# Altium footprint library common.PcbLib: 552 footprints (part 13 of 35)
Each footprint in its own frame and in the unit in brackets; x right, y up, seen from the top. Pads: shape width x height; smd on the part's side, far side on the other; paste and mask are expansions set on the pad; w line width, h text height; cw(c..) or ccw(c..) is an arc to the next point about the centre after c.
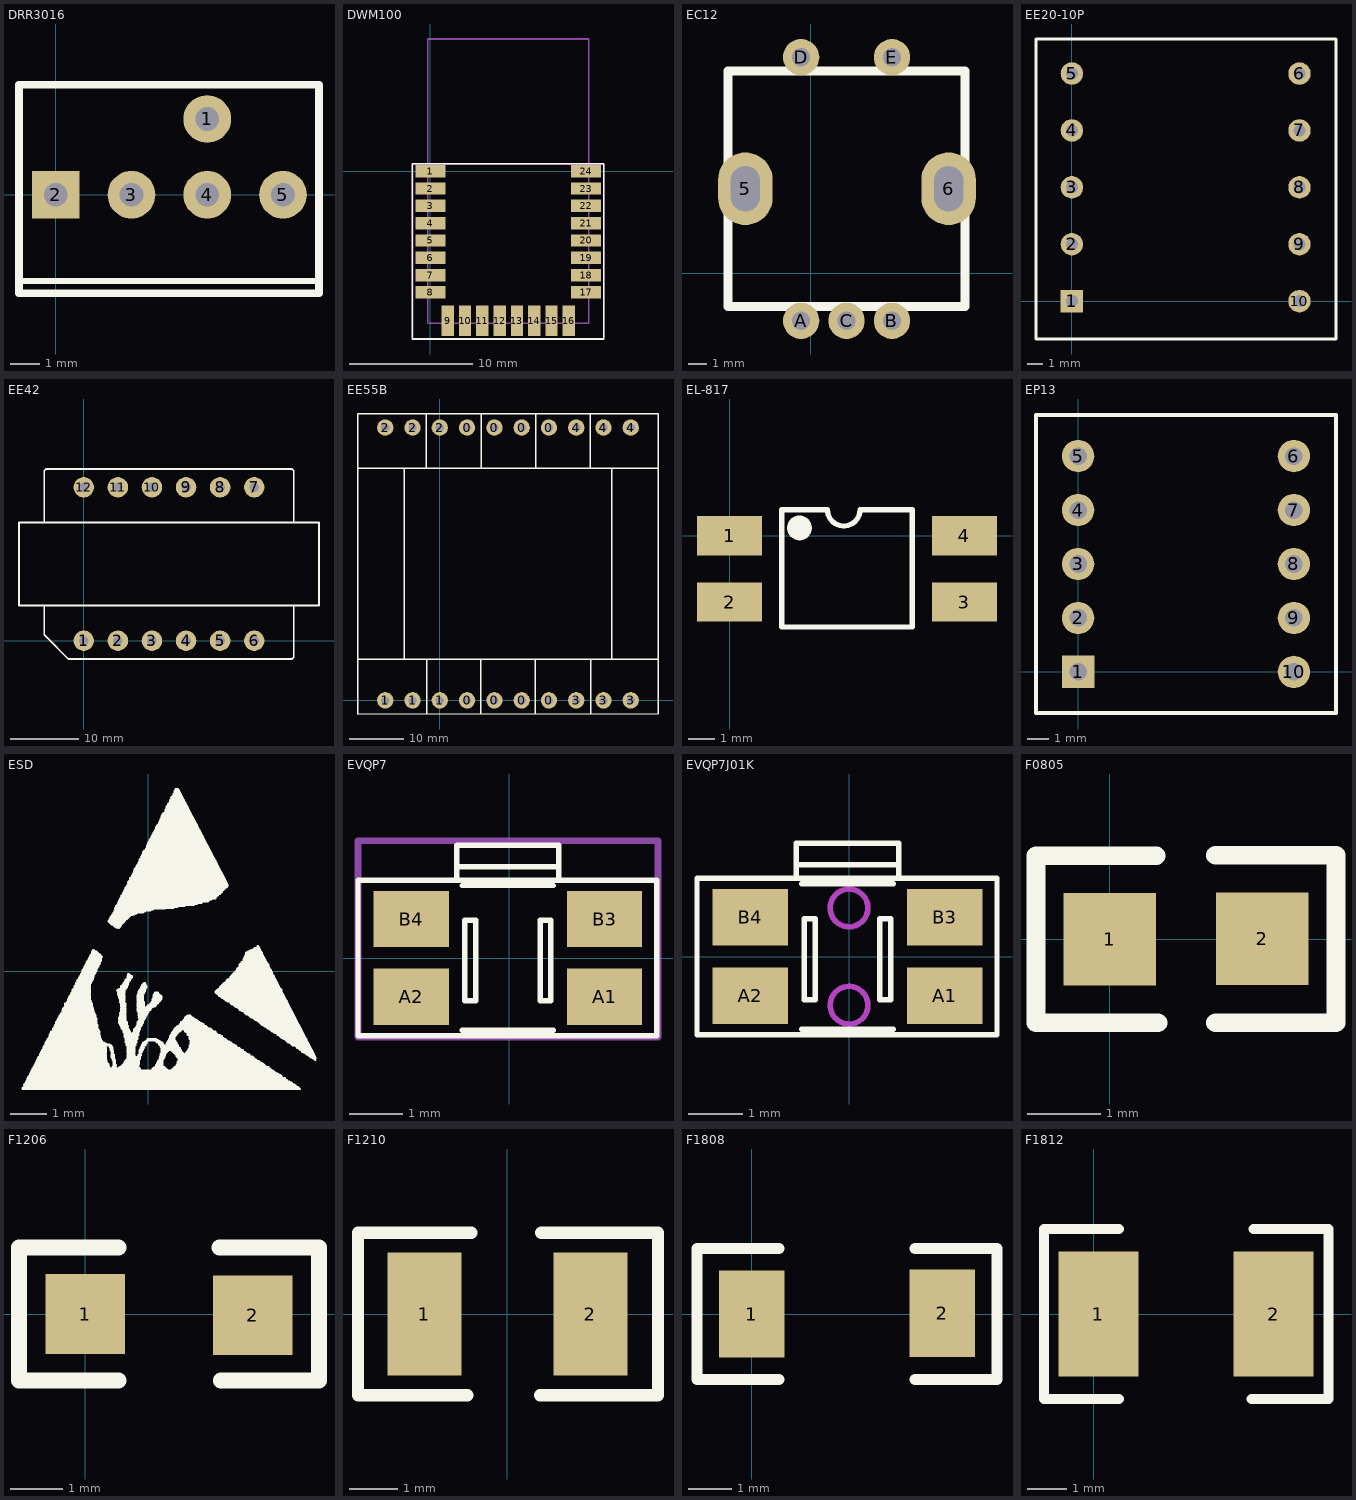
[diagram p12: the footprints below, top view; thin cyan lines are the x and y axes]

## DRR3016 [mm]
height 2.38
pads (5):
  round 1.6 hole 0.8: 1(5.08,2.54) 3(2.54,0) 4(5.08,0) 5(7.62,0)
  rect 1.6x1.6 hole 0.8: 2(0,0)
Top Overlay:
  lines w0.2: -1.23,-2.896 8.738,-2.896
  lines w0.254: -1.23,-3.3 -1.23,3.685 8.828,3.685 8.828,-3.3 -1.23,-3.3
3D body: height 11, standoff -2.9, extent -1.19,-3.306 8.81,3.694

## DWM100 [mm]
pads (24):
  rect 2.45x1 smd: 1(0,0) 2(0,-1.4) 3(0,-2.8) 4(0,-4.2) 5(0,-5.6) 6(0,-7) 7(0,-8.4) 8(0,-9.8) 17(12.59,-9.8) 18(12.59,-8.4) 19(12.59,-7) 20(12.59,-5.6) 21(12.59,-4.2) 22(12.59,-2.8) 23(12.59,-1.4) 24(12.59,0)
  rect 1x2.45 smd: 9(1.395,-12.095) 10(2.795,-12.095) 11(4.195,-12.095) 12(5.595,-12.095) 13(6.995,-12.095) 14(8.395,-12.095) 15(9.795,-12.095) 16(11.195,-12.095)
Top Overlay:
  lines w0.127: -1.475,-13.57 14.019,-13.57 14.019,0.625 -1.475,0.625 -1.475,-13.57
Mechanical 2:
  lines w0.127: -1.424,-13.57 -1.424,0.552 14.019,0.552 14.019,-13.57 -1.424,-13.57
  text ".Designator" at -0.586,-2.267 h1.52
  text ".Comment" at -0.586,-4.299 h0.76
Mechanical 14:
  lines w0.127: -0.205,-12.3 -0.205,10.7 12.795,10.7 12.795,-12.3 -0.205,-12.3
3D body: height 2.9, standoff -0.01, extent -0.228,-12.3 12.772,10.7

## EC12 [mm] "编码器"
pads (7):
  oval 3x4 hole 1.6 slot 2.5 at 90 deg: 5(-3.607,4.648) 6(7.569,4.648)
  round 2 hole 1: A(-0.544,-2.616) B(4.456,-2.616) C(1.956,-2.616) D(-0.544,11.884) E(4.456,11.884)
Top Overlay:
  lines w0.508: -4.561,-1.829 -4.561,11.125 8.469,11.125 8.469,-1.829 -4.561,-1.829
3D body: height 20.05, standoff -3.5, extent -5.014,-2.87 8.977,11.379

## EE20-10P [mm] "EF20"
height 0.272
pads (10):
  rect 1.5x1.5 hole 0.813: 1(0,0)
  round 1.5 hole 0.813: 2(0,3.8) 3(0,7.6) 4(0,11.4) 5(0,15.2) 6(15.2,15.2) 7(15.2,11.4) 8(15.2,7.6) 9(15.2,3.8) 10(15.2,0)
Top Overlay:
  lines w0.2: -2.396,-2.53 17.638,-2.53 17.638,17.506 -2.396,17.506 -2.396,-2.53
3D body: height 14.24, standoff -2.36, extent -2.619,-2.791 17.881,17.709

## EE42 [mm]
pads (12):
  round 3 hole 1.4: 1(0,0) 2(5,0) 3(10,0) 4(15,0) 5(20,0) 6(25,0) 7(25,22.5) 8(20,22.5) 9(15,22.5) 10(10,22.5) 11(5,22.5) 12(0,22.5)
Top Overlay:
  lines w0.254: -5.788,5.15 -5.788,0.856 -5.5,0.568 -2.232,-2.7 30.5,-2.7 30.788,-2.412 30.788,5.15 ; -5.788,17.35 -5.788,24.912 -5.5,25.2 30.5,25.2 30.788,24.912 30.788,17.35 ; -9.5,5.15 34.5,5.15 34.5,17.35 -9.5,17.35 -9.5,5.15
3D body: height 50.74, standoff -3.81, extent -8.001,-4.699 37.999,27.301

## EE55B [mm]
pads (20):
  round 3 hole 1.5: 0(5,0) 0(5,50) 0(10,0) 0(10,50) 0(15,0) 0(15,50) 0(20,0) 0(20,50) 1(-10,0) 1(-5,0) 1(0,0) 2(-10,50) 2(-5,50) 2(0,50) 3(25,0) 3(30,0) 3(35,0) 4(25,50) 4(30,50) 4(35,50)
Top Overlay:
  lines w0.254: -15,7.508 39.991,7.508 ; -15,42.534 39.991,42.534 ; -6.491,7.508 -6.491,42.534 ; -2.478,42.534 -2.478,52.491 ; -2.427,-2.5 -2.427,7.508 ; 7.479,-2.424 7.479,7.457 ; 7.581,42.534 7.581,52.491 ; 17.461,-2.475 17.461,7.508 ; 17.537,42.636 17.537,52.491 ; 27.57,42.585 27.57,52.491 ; 27.697,-2.424 27.697,7.406 ; 31.507,7.508 31.507,42.534 ; -15,-2.5 -15,52.491 39.991,52.491 39.991,-2.475 -15,-2.5
3D body: height 49.78, standoff -4.45, extent -15.113,-2.794 40.717,52.336

## EL-817 [mm]
pads (4):
  rect 2.5x1.5 smd: 1(0,0) 2(0,-2.54) 3(9,-2.54) 4(9,0)
Top Overlay:
  circle w0.5: c2.676,0.3 r0.224
  lines w0.2: 3.7,1 2,1 2,-3.5 7,-3.5 7,1 5,1 cw(c4.375,1) 3.75,1
3D body: height 3.75, standoff -0.01, extent -0.52,-3.569 9.64,1.029

## EP13 [mm]
height 0.272
pads (10):
  rect 1.5x1.5 hole 0.813: 1(0,0)
  round 1.5 hole 0.813: 2(0,2.5) 3(0,5) 4(0,7.5) 5(0,10) 6(10,10) 7(10,7.5) 8(10,5) 9(10,2.5) 10(10,0)
Top Overlay:
  lines w0.2: -1.95,-1.9 11.95,-1.9 11.95,11.9 -1.95,11.9 -1.95,-1.9
3D body: height 12.4, standoff -4, extent -1.501,-1.502 11.501,11.5

## ESD [mm]
Top Overlay:
  drawing of 1212 lines, arcs and shapes, not listed

## EVQP7 [mm] "PUSH BUTTON EVQP7 SERIES SWITCH"
pads (4):
  rect 1.4x1.05 smd: A1(1.772,-0.722) A2(-1.828,-0.722) B3(1.772,0.728) B4(-1.828,0.728)
Top Overlay:
  lines w0.1: -0.978,1.703 0.922,1.703 ; -0.878,-1.347 0.822,-1.347 ; -0.878,1.353 0.822,1.353 ; -0.978,1.453 -0.978,2.103 0.922,2.103 0.922,1.703 ; -0.978,1.453 -2.819,1.453 -2.819,-1.447 2.743,-1.447 2.743,1.453 0.922,1.453 ; -0.978,1.453 0.922,1.453 ; 0.922,1.453 0.922,1.703 ; -0.828,-0.797 -0.628,-0.797 -0.628,0.703 -0.828,0.703 -0.828,-0.797 ; 0.572,-0.797 0.772,-0.797 0.772,0.703 0.572,0.703 0.572,-0.797
Mechanical 2:
  lines w0.127: -2.819,2.184 -2.819,-1.473 2.769,-1.473 2.769,2.184 -2.769,2.184
  text ".Designator" at -2.642,0.229 h0.76
3D body: height 1.35, standoff 0, extent -2.35,-1.46 2.35,2.09

## EVQP7J01K [mm] "PUSH BUTTON SWITCH"
pads (4):
  rect 1.4x1.05 smd: A1(1.772,-0.722) A2(-1.828,-0.722) B3(1.772,0.728) B4(-1.828,0.728)
Top Overlay:
  lines w0.1: -0.978,1.703 0.922,1.703 ; -0.878,-1.347 0.822,-1.347 ; -0.878,1.353 0.822,1.353 ; -0.978,1.453 -0.978,2.103 0.922,2.103 0.922,1.703 ; -0.978,1.453 -2.819,1.453 -2.819,-1.447 2.743,-1.447 2.743,1.453 0.922,1.453 ; -0.978,1.453 0.922,1.453 ; 0.922,1.453 0.922,1.703 ; -0.828,-0.797 -0.628,-0.797 -0.628,0.703 -0.828,0.703 -0.828,-0.797 ; 0.572,-0.797 0.772,-0.797 0.772,0.703 0.572,0.703 0.572,-0.797
Keep-Out Layer:
  circle w0.1: c0,0.91 r0.35
  circle w0.1: c0,-0.9 r0.35
Mechanical 1:
  circle w0.1: c0,0.9 r0.35
  circle w0.1: c0,-0.9 r0.35
3D body: height 1.35, standoff 0, extent -2.35,-1.46 2.35,2.09

## F0805 [mm] "1/8W"
pads (2):
  rect 1.27x1.27 smd: 1(0,0) 2(2.09,0.005)
Top Overlay:
  lines w0.254: 0.635,1.143 -1.011,1.143 -1.011,-1.143 0.66,-1.143 ; 1.448,-1.143 3.099,-1.143 3.099,1.148 1.448,1.148
3D body: height 0.75, standoff -0.75, extent -0.064,-0.635 2.146,0.61

## F1206 [mil] "1/4W"
pads (2):
  rect 60x60 smd: 1(0,0) 2(126,-1)
Top Overlay:
  lines w12: 25,-50 -50,-50 -50,50 25,50 ; 101,50 176,50 176,-50 102,-50
3D body: height 22.09, standoff -0.04, extent -0.02,-32.51 126.04,32.53

## F1210 [mil]
pads (2):
  rect 60x100 smd: 1(-67.5,0) 2(67.5,0)
Top Overlay:
  lines w10: -32.5,-66 -121.5,-66 -121.5,66 -29.5,66 ; 26.5,-66 122.5,-66 122.5,66 ; 27.5,66 121.3,66
3D body: height 26.57, standoff 0, extent -63.78,-50.68 62.79,50.69

## F1808 [mil]
pads (2):
  rect 60x80 smd: 1(0,0) 2(174.88,0.76)
Top Overlay:
  lines w10: 25,-60 -50,-60 -50,60 25,60 ; 150,-60 225,-60 225,60 150,60
3D body: height 39.37, standoff 0, extent -2.88,-37.48 174.88,39

## F1812 [mil] "1/2W"
pads (2):
  rect 80x125 smd: 1(4.39,-0.02) 2(180,-0.02)
Top Overlay:
  lines w10: 25,-85 -50,-85 -50,85 25,85 ; 158,-85 160,-85 235,-85 235,85 160,85 ; 159,-85 161,-85
3D body: height 51.97, standoff 0, extent 0.12,-63.39 189.89,63.38